# Altium footprint library module-footprint.PcbLib: 27 footprints (part 1 of 2)
Each footprint in its own frame and in the unit in brackets; x right, y up, seen from the top. Pads: shape width x height; smd on the part's side, far side on the other; paste and mask are expansions set on the pad; w line width, h text height; cw(c..) or ccw(c..) is an arc to the next point about the centre after c.
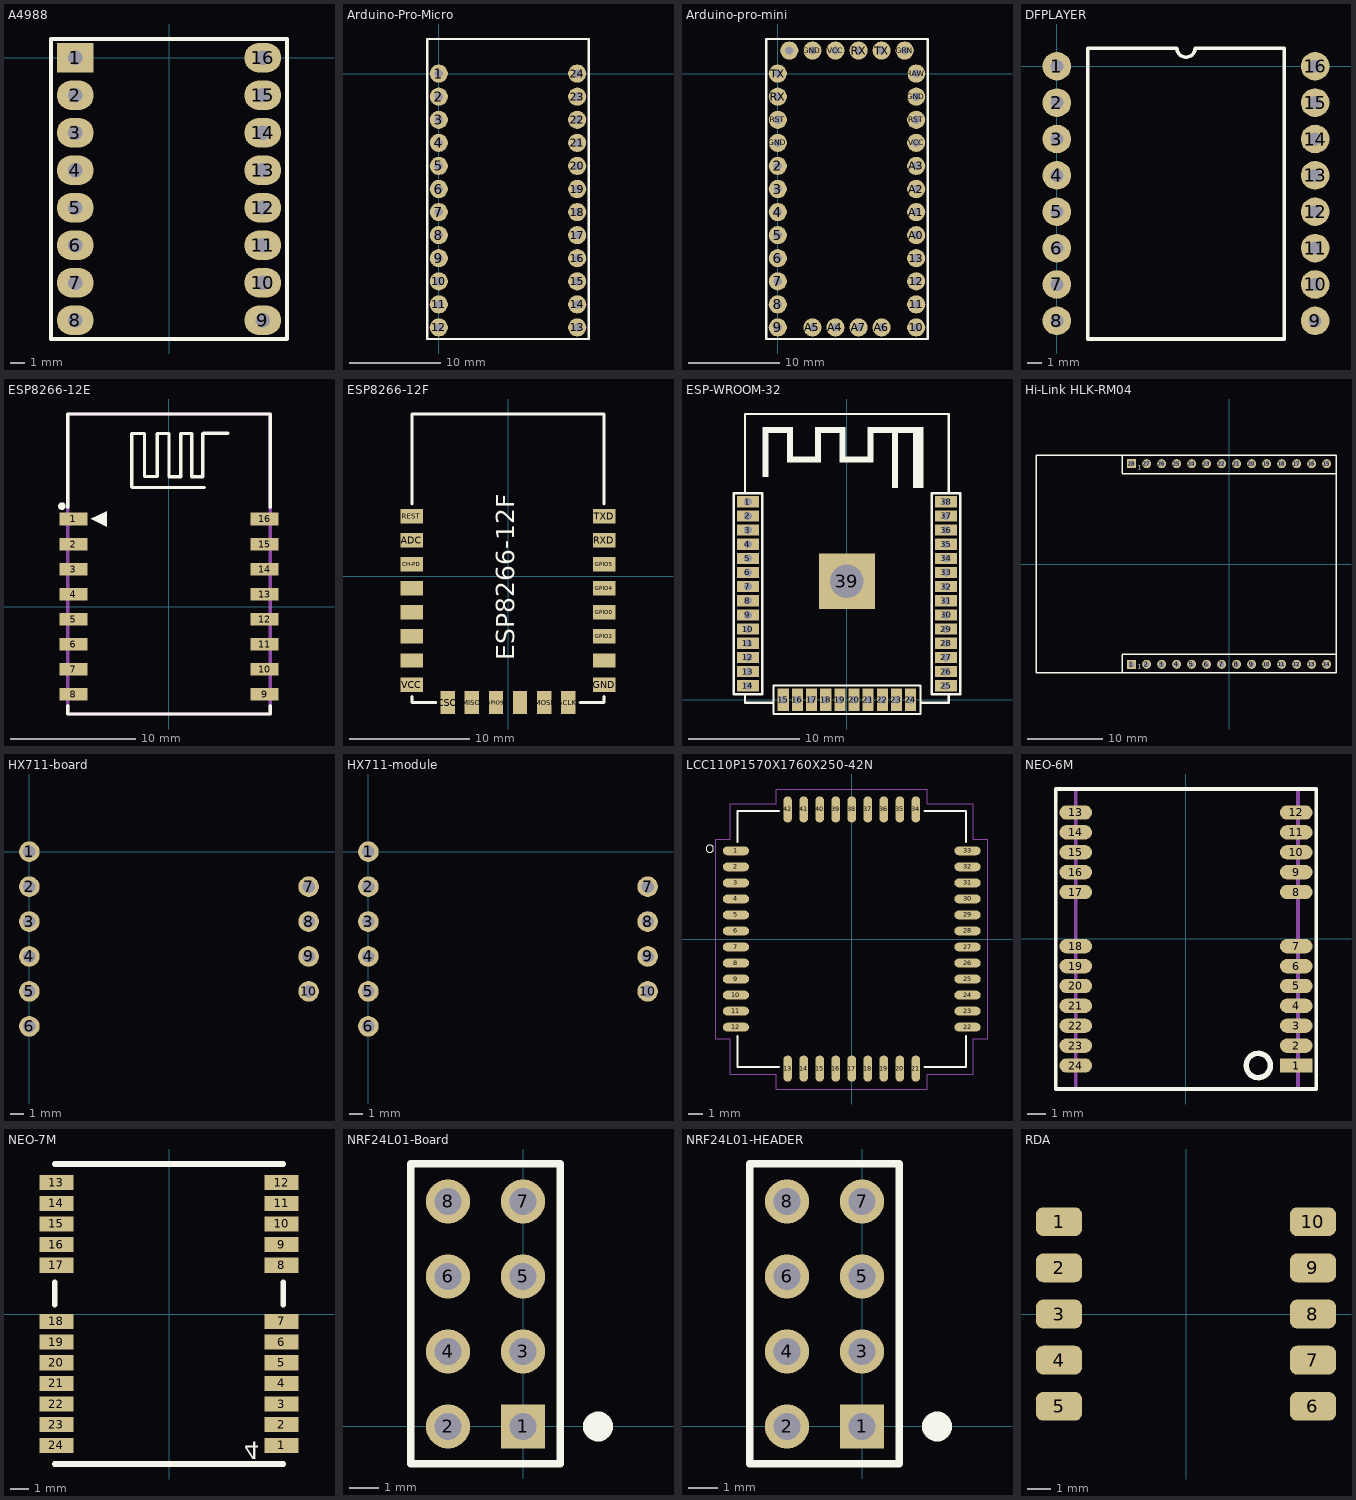
[diagram p0: the footprints below, top view; thin cyan lines are the x and y axes]

## A4988 [mm]
pads (16):
  rect 2.5x2 hole 1: 1(-6.35,0)
  oval 2.5x2 hole 1: 2(-6.35,-2.54) 3(-6.35,-5.08) 4(-6.35,-7.62) 5(-6.35,-10.16) 6(-6.35,-12.7) 7(-6.35,-15.24) 8(-6.35,-17.78) 9(6.35,-17.78) 10(6.35,-15.24) 11(6.35,-12.7) 12(6.35,-10.16) 13(6.35,-7.62) 14(6.35,-5.08) 15(6.35,-2.54) 16(6.35,0)
Top Overlay:
  lines w0.254: -8,-19.05 8,-19.05 8,1.27 -8,1.27 -8,-19.05
3D body "pin_header_aw140-eg-g08d.stp": height 14, standoff 2.8, extent 5.122,-19.05 7.62,1.27
3D body "pin_header_aw140-eg-g08d.stp": height 14, standoff 2.8, extent -7.599,-19.05 -5.101,1.27
3D body "a4988-stepper-motor-driver-carrier.step": height 14.37, standoff 11, extent -7.62,-19.05 7.62,1.27
3D body "female_header_a-bl254-eg-g08d.stp": height 8.5, standoff -3.2, extent 5.1,-19.175 7.6,1.395
3D body "female_header_a-bl254-eg-g08d.stp": height 8.5, standoff -3.2, extent -7.58,-19.05 -5.08,1.52

## Arduino-Pro-Micro [mm]
pads (24):
  round 2 hole 0.9: 1(0,0) 2(0,-2.54) 3(0,-5.08) 4(0,-7.62) 5(0,-10.16) 6(0,-12.7) 7(0,-15.24) 8(0,-17.78) 9(0,-20.32) 10(0,-22.86) 11(0,-25.4) 12(0,-27.94) 13(15.24,-27.94) 14(15.24,-25.4) 15(15.24,-22.86) 16(15.24,-20.32) 17(15.24,-17.78) 18(15.24,-15.24) 19(15.24,-12.7) 20(15.24,-10.16) 21(15.24,-7.62) 22(15.24,-5.08) 23(15.24,-2.54) 24(15.24,0)
Top Overlay:
  lines w0.254: -1.27,-29.21 16.51,-29.21 16.51,3.81 -1.27,3.81 -1.27,-29.21

## Arduino-pro-mini [mm]
pads (34):
  round 2 hole 0.9: 2(0,-10.16) 3(0,-12.7) 4(0,-15.24) 5(0,-17.78) 6(0,-20.32) 7(0,-22.86) 8(0,-25.4) 9(0,-27.94) 10(15.24,-27.94) 11(15.24,-25.4) 12(15.24,-22.86) 13(15.24,-20.32) A0(15.24,-17.78) A1(15.24,-15.24) A2(15.24,-12.7) A3(15.24,-10.16) A4(6.35,-27.94) A5(3.81,-27.94) A6(11.43,-27.94) A7(8.89,-27.94) GND(0,-7.62) GND(3.81,2.54) GND(15.24,-2.54) GRN(13.97,2.54) RAW(15.24,0) RST(0,-5.08) RST(15.24,-5.08) RX(0,-2.54) RX(8.89,2.54) TX(0,0) TX(11.43,2.54) VCC(6.35,2.54) VCC(15.24,-7.62) ""(1.27,2.54)
Top Overlay:
  lines w0.254: -1.27,-29.21 16.51,-29.21 16.51,3.81 -1.27,3.81 -1.27,-29.21
3D body "final.STEP": height 16.59, standoff 9.99, extent -1.49,-29.45 16.51,4.05
3D body "female_header_a-bl254-eg-g04d.stp": height 8.5, standoff -3.2, extent 2.415,-29.19 12.825,-26.69
3D body "female_header_a-bl254-eg-g06d.stp": height 8.5, standoff -3.2, extent -0.125,1.29 15.365,3.79
3D body "female_header_a-bl254-eg-g12d.stp": height 8.5, standoff -3.2, extent 13.99,-29.335 16.49,1.395
3D body "female_header_a-bl254-eg-g12d.stp": height 8.5, standoff -3.2, extent -1.25,-29.335 1.25,1.395
3D body "pin_header_aw140-eg-g04d.stp": height 14.2, standoff 3, extent 2.64,-29.193 12.8,-26.694
3D body "pin_header_aw140-eg-g06d.stp": height 14.2, standoff 3, extent 0.1,1.287 15.34,3.786
3D body "pin_header_aw140-eg-g12d.stp": height 14.2, standoff 3, extent 13.994,-29.11 16.493,1.37
3D body "pin_header_aw140-eg-g12d.stp": height 14.2, standoff 3, extent -1.246,-29.11 1.253,1.37

## DFPLAYER [mm]
pads (16):
  round 2 hole 0.9: 1(0,0) 2(0,-2.54) 3(0,-5.08) 4(0,-7.62) 5(0,-10.16) 6(0,-12.7) 7(0,-15.24) 8(0,-17.78) 9(18.034,-17.78) 10(18.034,-15.24) 11(18.034,-12.7) 12(18.034,-10.16) 13(18.034,-7.62) 14(18.034,-5.08) 15(18.034,-2.54) 16(18.034,0)
Top Overlay:
  lines w0.254: 2.159,-19.05 2.159,1.27 8.382,1.27 ccw(c9.017,1.27) 9.652,1.27 15.875,1.27 15.875,-19.05 2.159,-19.05
3D body "DFPlayerWithCard.stp": height 8, standoff -3.2, extent -1.51,-21.95 19.29,1.51

## ESP8266-12E [mm]
pads (16):
  rect 2.25x1 smd: 1(-7.625,7) 2(-7.625,5) 3(-7.625,3) 4(-7.625,1) 5(-7.625,-1) 6(-7.625,-3) 7(-7.625,-5) 8(-7.625,-7) 9(7.625,-7) 10(7.625,-5) 11(7.625,-3) 12(7.625,-1) 13(7.625,1) 14(7.625,3) 15(7.625,5) 16(7.625,7)
Top Overlay:
  circle w0.3: c-8.55,8.025 r0.15
  region: -6.23,7 -4.96,6.365 -4.96,7.635
  lines w0.254: -8.084,-7.916 -8.084,-8.568 8.084,-8.568 8.084,-7.916 ; -8.084,7.916 -8.084,15.371 8.084,15.371 8.084,7.916 ; 2.842,9.525 -2.933,9.525 -2.975,9.567 -2.975,13.825 -1.959,13.825 -1.959,10.391 -0.943,10.391 -0.943,13.82 -0.008,13.82 -0.008,10.35 0.017,10.375 0.942,10.375 0.942,13.825 1.817,13.825 1.817,10.375 2.692,10.375 2.692,13.8 2.742,13.85 4.717,13.85
Mechanical 13:
  lines w0.051: -8.127,9.727 -8.127,15.382 8.129,15.382 8.129,9.727
  lines w0.254: -8.084,-8.568 8.084,-8.568 8.084,15.371 -8.084,15.371 -8.084,-8.568
3D body "User Library-ESP8266-12E.STEP": height 2.6, standoff -0.4, extent -7.75,-8.5 8.25,15.88

## ESP8266-12F [mm]
pads (22):
  rect 1.9x1.2 smd: ADC(-8,3) CH-PD(-8,1) GND(8,-9) GPIO0(8,-3) GPIO2(8,-5) GPIO4(8,-1) GPIO5(8,1) GPIO12(-8,-5) GPIO13(-8,-7) GPIO14(-8,-3) GPIO15(8,-7) GPIO16(-8,-1) REST(-8,5) RXD(8,3) TXD(8,5) VCC(-8,-9)
  rect 1.2x1.9 smd: CSO(-5,-10.5) GPIO9(-1,-10.5) GPIO10(1,-10.5) MISO(-3,-10.5) MOSI(3,-10.5) SCLK(5,-10.5)
Top Overlay:
  lines w0.254: -8,-10 -8,-10.5 -6,-10.5 ; -8,6 -8,13.5 8,13.5 8,6 ; 6,-10.5 8,-10.5 8,-10
  text "ESP8266-12F" at 0.5,-7 h1.52
3D body "ESP8266-12F.STEP": height 3.1, standoff 0, extent -8,-10.5 8,13.5

## ESP-WROOM-32 [mm]
pads (39):
  rect 2x1 hole 0.7 mask+0.05: 1(-8.89,17.78) 2(-8.89,16.51) 3(-8.89,15.24) 4(-8.89,13.97) 5(-8.89,12.7) 6(-8.89,11.43) 7(-8.89,10.16) 8(-8.89,8.89) 9(-8.89,7.62) 10(-8.89,6.35) 11(-8.89,5.08) 12(-8.89,3.81) 13(-8.89,2.54) 14(-8.89,1.27) 25(8.89,1.27) 26(8.89,2.54) 27(8.89,3.81) 28(8.89,5.08) 29(8.89,6.35) 30(8.89,7.62) 31(8.89,8.89) 32(8.89,10.16) 33(8.89,11.43) 34(8.89,12.7) 35(8.89,13.97) 36(8.89,15.24) 37(8.89,16.51) 38(8.89,17.78)
  rect 1x2 hole 0.7 mask+0.05: 15(-5.715,0) 16(-4.445,0) 17(-3.175,0) 18(-1.905,0) 19(-0.635,0) 20(0.635,0) 21(1.905,0) 22(3.175,0) 23(4.445,0) 24(5.715,0)
  rect 5x5 hole 3 mask+0.05: 39(0,10.65)
Top Overlay:
  region: 6.858,19.05 6.858,24.45 1.858,24.45 1.858,21.81 -0.142,21.81 -0.142,24.45 -2.842,24.45 -2.842,21.81 -4.842,21.81 -4.842,24.45 -7.542,24.45 -7.542,20.01 -7.042,20.01 -7.042,23.95 -5.342,23.95 -5.342,21.31 -2.342,21.31 -2.342,23.95 -0.642,23.95 -0.642,21.31 2.358,21.31 2.358,23.95 4.058,23.95 4.058,19.05 4.558,19.05 4.558,23.95 5.958,23.95 5.958,19.05
  lines w0.2: -9.144,0.508 -9.144,-0.254 -6.604,-0.254 ; -9.144,18.542 -9.144,25.654 9.144,25.654 9.144,18.542 ; 6.604,-0.254 9.144,-0.254 9.144,0.508 ; -10.16,0.508 -10.16,18.542 -7.611,18.542 -7.611,0.508 -10.16,0.508 ; -6.604,-1.27 -6.604,1.279 6.604,1.279 6.604,-1.27 -6.604,-1.27 ; 7.62,0.508 10.169,0.508 10.169,18.542 7.62,18.542 7.62,0.508
3D body "User Library-ESP321.STEP": height 2.91, standoff -0.01, extent -9,-0.05 9,25.45

## Hi-Link HLK-RM04 [mm]
pads (28):
  rect 1.2x1.2 hole 0.8: 1(-13,-13.375) 28(-13,13.375)
  round 1.2 hole 0.8: 2(-11,-13.375) 3(-9,-13.375) 4(-7,-13.375) 5(-5,-13.375) 6(-3,-13.375) 7(-1,-13.375) 8(1,-13.375) 9(3,-13.375) 10(5,-13.375) 11(7,-13.375) 12(9,-13.375) 13(11,-13.375) 14(13,-13.375) 15(13,13.375) 16(11,13.375) 17(9,13.375) 18(7,13.375) 19(5,13.375) 20(3,13.375) 21(1,13.375) 22(-1,13.375) 23(-3,13.375) 24(-5,13.375) 25(-7,13.375) 26(-9,13.375) 27(-11,13.375)
Top Overlay:
  lines w0.2: -14.25,-14.5 -14.25,-12 14.25,-12 ; -14.25,14.5 -14.25,12 14.25,12 ; -25.75,-14.5 -25.75,14.5 14.25,14.5 14.25,-14.5 -25.75,-14.5
  text "1" at -12.2,12.35 h1
  text "1" at -12.2,-14.15 h1
3D body "User Library-HLK-RM04.STEP": height 10.32, standoff 0.55, extent -25.9,-14.6 14.2,14.46
3D body: height 4, standoff -2.8, extent -14.25,12 14.25,14.5
3D body: height 4, standoff -2.8, extent -14.25,-14.5 14.25,-12

## HX711-board [mm] "HX711 Module Board Mount"
pads (10):
  round 1.5 hole 0.9: 1(0,0) 2(0,-2.54) 3(0,-5.08) 4(0,-7.62) 5(0,-10.16) 6(0,-12.7) 7(20.32,-2.54) 8(20.32,-5.08) 9(20.32,-7.62) 10(20.32,-10.16)
3D body "pin_header_aw140-eg-g06d.stp": height 5.8, standoff -5.4, extent -1.228,-13.97 1.27,1.27
3D body "pin_header_aw140-eg-g04d.stp": height 5.8, standoff -5.4, extent 19.092,-11.43 21.59,-1.27
3D body "hx711.STEP": height 6.7, standoff 3.1, extent -1.84,-14.476 22.16,1.524

## HX711-module [mm] "HX711 Module on Pin Header"
pads (10):
  round 1.5 hole 0.9: 1(0,0) 2(0,-2.54) 3(0,-5.08) 4(0,-7.62) 5(0,-10.16) 6(0,-12.7) 7(20.32,-2.54) 8(20.32,-5.08) 9(20.32,-7.62) 10(20.32,-10.16)
3D body "hx711.STEP": height 15.1, standoff 11.5, extent -1.84,-14.476 22.16,1.524
3D body "pin_header_aw140-eg-g04d.stp": height 14.2, standoff 3, extent 19.092,-11.43 21.59,-1.27
3D body "pin_header_aw140-eg-g06d.stp": height 14.2, standoff 3, extent -1.228,-13.97 1.27,1.27
3D body "female_header_a-bl254-eg-g06d.stp": height 8.5, standoff -3.2, extent -1.23,-14.095 1.27,1.395
3D body "female_header_a-bl254-eg-g04d.stp": height 8.5, standoff -3.2, extent 19.09,-11.68 21.59,-1.27

## LCC110P1570X1760X250-42N [mm]
pads (42):
  oval 1.8x0.6 smd paste-25.4: 1(-7.95,6.05) 2(-7.95,4.95) 3(-7.95,3.85) 4(-7.95,2.75) 5(-7.95,1.65) 6(-7.95,0.55) 7(-7.95,-0.55) 8(-7.95,-1.65) 9(-7.95,-2.75) 10(-7.95,-3.85) 11(-7.95,-4.95) 12(-7.95,-6.05) 22(7.95,-6.05) 23(7.95,-4.95) 24(7.95,-3.85) 25(7.95,-2.75) 26(7.95,-1.65) 27(7.95,-0.55) 28(7.95,0.55) 29(7.95,1.65) 30(7.95,2.75) 31(7.95,3.85) 32(7.95,4.95) 33(7.95,6.05)
  oval 0.6x1.8 smd paste-25.4: 13(-4.4,-8.9) 14(-3.3,-8.9) 15(-2.2,-8.9) 16(-1.1,-8.9) 17(0,-8.9) 18(1.1,-8.9) 19(2.2,-8.9) 20(3.3,-8.9) 21(4.4,-8.9) 34(4.4,8.9) 35(3.3,8.9) 36(2.2,8.9) 37(1.1,8.9) 38(0,8.9) 39(-1.1,8.9) 40(-2.2,8.9) 41(-3.3,8.9) 42(-4.4,8.9)
Top Overlay:
  circle w0: c-9.75,6.2 r0.254
  lines w0.127: -7.85,-6.65 -7.85,-8.8 -5,-8.8 ; -7.85,6.65 -7.85,8.8 -5,8.8 ; 5,-8.8 7.85,-8.8 7.85,-6.65 ; 5,8.8 7.85,8.8 7.85,6.65
Top Paste:
  drawing of 84 lines, arcs and shapes, not listed
Mechanical 1:
  lines w0.05: -9.35,-6.85 -8.35,-6.85 -8.35,-9.3 -5.2,-9.3 -5.2,-10.3 5.2,-10.3 5.2,-9.3 8.35,-9.3 8.35,-6.85 9.35,-6.85 9.35,6.85 8.35,6.85 8.35,9.3 5.2,9.3 5.2,10.3 -5.2,10.3 -5.2,9.3 -8.35,9.3 -8.35,6.85 -9.35,6.85 -9.35,-6.85
3D body "User Library-SIM800C-1.STEP": height 2.27, standoff -0.07, extent -7.85,-8.8 7.85,8.8

## NEO-6M [mm]
pads (24):
  rect 1.8x0.8 smd: 1(6.1,-7)
  oval 1.8x0.8 smd: 2(6.1,-5.9) 3(6.1,-4.8) 4(6.1,-3.7) 5(6.1,-2.6) 6(6.1,-1.5) 7(6.1,-0.4) 8(6.1,2.6) 9(6.1,3.7) 10(6.1,4.8) 11(6.1,5.9) 12(6.1,7) 13(-6.1,7) 14(-6.1,5.9) 15(-6.1,4.8) 16(-6.1,3.7) 17(-6.1,2.6) 18(-6.1,-0.4) 19(-6.1,-1.5) 20(-6.1,-2.6) 21(-6.1,-3.7) 22(-6.1,-4.8) 23(-6.1,-5.9) 24(-6.1,-7)
Top Overlay:
  circle w0.3: c4,-7 r0.671
  lines w0.2: -7.2,-8.3 -7.2,8.3 7.2,8.3 7.2,-8.3 -7.2,-8.3
Mechanical 1:
  lines w0.2: -6.1,-8.3 6.2,-8.3 6.2,8.3 -6.1,8.3 -6.1,-8.3
3D body "User Library-UBLOX_GPS_NEO-6M.STEP": height 2.64, standoff 0, extent -6.18,-8.3 6.18,8.3

## NEO-7M [mm] "GNSS modules"
pads (24):
  rect 1.8x0.8 smd: 1(6,-7) 2(6,-5.9) 3(6,-4.8) 4(6,-3.7) 5(6,-2.6) 6(6,-1.5) 7(6,-0.4) 8(6,2.6) 9(6,3.7) 10(6,4.8) 11(6,5.9) 12(6,7) 13(-6,7) 14(-6,5.9) 15(-6,4.8) 16(-6,3.7) 17(-6,2.6) 18(-6,-0.4) 19(-6,-1.5) 20(-6,-2.6) 21(-6,-3.7) 22(-6,-4.8) 23(-6,-5.9) 24(-6,-7)
Top Overlay:
  lines w0.3: -6.1,-8 6.1,-8 ; -6.1,0.5 -6.1,1.7 ; -6.1,8 6.1,8 ; 6.1,0.5 6.1,1.7
  text "4" at 4,-6.5 h1.6
3D body "User Library-UBLOX_GPS_NEO-6M.step": height 2.64, standoff 0, extent -6.2,-8.3 6.16,8.3

## NRF24L01-Board [mm]
height 6
pads (8):
  rect 1.5x1.5 hole 0.9: 1(0,0)
  round 1.5 hole 0.9: 2(-2.54,0) 3(0,2.54) 4(-2.54,2.54) 5(0,5.08) 6(-2.54,5.08) 7(0,7.62) 8(-2.54,7.62)
Top Overlay:
  circle w0.508: c2.54,0 r0.254
  lines w0.254: -3.81,-1.27 1.27,-1.27 1.27,8.89 -3.81,8.89 -3.81,-1.27
3D body "User Library-NRF24L01.STEP": height 6.5, standoff -5.95, extent -27.456,-1.675 1.544,13.325

## NRF24L01-HEADER [mm]
height 15
pads (8):
  rect 1.5x1.5 hole 0.9: 1(0,0)
  round 1.5 hole 0.9: 2(-2.54,0) 3(0,2.54) 4(-2.54,2.54) 5(0,5.08) 6(-2.54,5.08) 7(0,7.62) 8(-2.54,7.62)
Top Overlay:
  circle w0.508: c2.54,0 r0.254
  lines w0.254: -3.81,-1.27 -3.81,8.89 1.27,8.89 1.27,-1.27 -3.81,-1.27
3D body "User Library-NRF24L01.STEP": height 14.5, standoff 2.05, extent -27.456,-1.675 1.544,13.325
3D body "female_header_a-bl254-dg-g08d.stp": height 8.5, standoff -3.2, extent -3.77,-1.395 1.23,9.015

## RDA [mm]
pads (10):
  rrect50% 2x1.25 smd: 1(-5.5,4) 2(-5.5,2) 3(-5.5,0) 4(-5.5,-2) 5(-5.5,-4) 6(5.5,-4) 7(5.5,-2) 8(5.5,0) 9(5.5,2) 10(5.5,4)
3D body "RDA.STEP": height 2.1, standoff 0, extent -5.5,-5.5 5.5,5.5